# Altium footprint library PCB_THA.PcbLib: 22 footprints (part 2 of 2)
Each footprint in its own frame and in the unit in brackets; x right, y up, seen from the top. Pads: shape width x height; smd on the part's side, far side on the other; paste and mask are expansions set on the pad; w line width, h text height; cw(c..) or ccw(c..) is an arc to the next point about the centre after c.
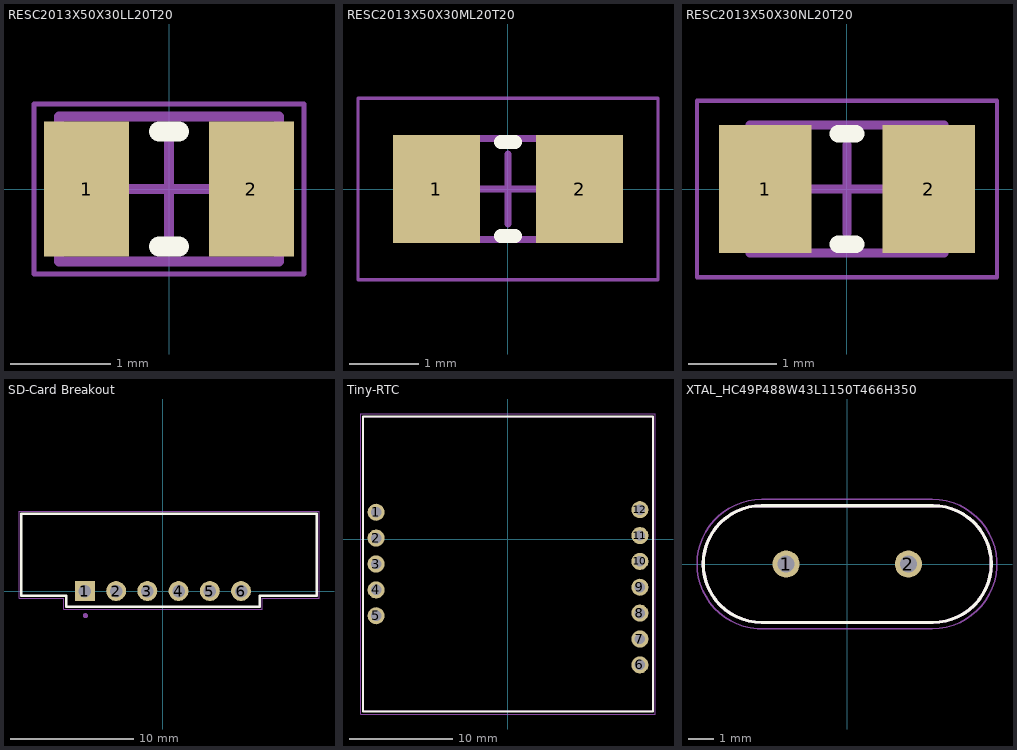
[diagram p1: the footprints below, top view; thin cyan lines are the x and y axes]

## RESC2013X50X30LL20T20 [mm] "Chip Resistor, 2-Leads, Body 2.00x1.25mm, IPC High Density"
height 0.5
pads (2):
  rect 0.85x1.35 smd: 1(-0.825,0) 2(0.825,0)
Top Overlay:
  lines w0.2: -0.1,-0.575 0.1,-0.575 ; -0.1,0.575 0.1,0.575
Top Designator:
  text ".Designator" at 7.618,-0.508 h1.52
Top 3D Body:
  lines w0.1: -1.1,-0.725 -1.1,0.725 1.1,0.725 1.1,-0.725 -1.1,-0.725
Top Courtyard:
  lines w0.05: -1.35,-0.85 -1.35,0.85 1.35,0.85 1.35,-0.85 -1.35,-0.85
  lines w0.1: -0.5,0 0.5,0 ; 0,-0.5 0,0.5
3D body: height 0.5, standoff 0, extent -0.8,-0.725 0.8,0.725
3D body: height 0.5, standoff 0, extent -1.1,-0.725 -0.8,0.725
3D body: height 0.5, standoff 0, extent 0.8,-0.725 1.1,0.725

## RESC2013X50X30ML20T20 [mm] "Chip Resistor, 2-Leads, Body 2.00x1.25mm, IPC Low Density"
height 0.5
pads (2):
  rect 1.25x1.55 smd: 1(-1.025,0) 2(1.025,0)
Top Overlay:
  lines w0.2: -0.1,-0.675 0.1,-0.675 ; -0.1,0.675 0.1,0.675
Top Designator:
  text ".Designator" at 7.618,-0.508 h1.52
Top 3D Body:
  lines w0.1: -1.1,-0.725 1.1,-0.725 1.1,0.725 -1.1,0.725 -1.1,-0.725
Top Courtyard:
  lines w0.05: -2.15,-1.3 2.15,-1.3 2.15,1.3 -2.15,1.3 -2.15,-1.3
  lines w0.1: -0.5,0 0.5,0 ; 0,-0.5 0,0.5
3D body: height 0.5, standoff 0, extent 0.8,-0.725 1.1,0.725
3D body: height 0.5, standoff 0, extent -1.1,-0.725 -0.8,0.725
3D body: height 0.5, standoff 0, extent -0.8,-0.725 0.8,0.725

## RESC2013X50X30NL20T20 [mm] "Chip Resistor, 2-Leads, Body 2.00x1.25mm, IPC Medium Density"
height 0.5
pads (2):
  rect 1.05x1.45 smd: 1(-0.925,0) 2(0.925,0)
Top Overlay:
  lines w0.2: -0.1,-0.625 0.1,-0.625 ; -0.1,0.625 0.1,0.625
Top Designator:
  text ".Designator" at 7.618,-0.508 h1.52
Top 3D Body:
  lines w0.1: -1.1,-0.725 1.1,-0.725 1.1,0.725 -1.1,0.725 -1.1,-0.725
Top Courtyard:
  lines w0.05: -1.7,-1 1.7,-1 1.7,1 -1.7,1 -1.7,-1
  lines w0.1: -0.5,0 0.5,0 ; 0,-0.5 0,0.5
3D body: height 0.5, standoff 0, extent 0.8,-0.725 1.1,0.725
3D body: height 0.5, standoff 0, extent -1.1,-0.725 -0.8,0.725
3D body: height 0.5, standoff 0, extent -0.8,-0.725 0.8,0.725

## SD-Card Breakout [mm]
pads (6):
  rect 1.62x1.62 hole 1.02: 1(-6.35,0)
  round 1.62 hole 1.02: 2(-3.81,0) 3(-1.27,0) 4(1.27,0) 5(3.81,0) 6(6.35,0)
Top Overlay:
  lines w0.2: -11.51,-0.4 -7.87,-0.4 -7.87,-1.27 7.87,-1.27 7.87,-0.4 12.49,-0.4 12.49,6.3 -11.51,6.3 -11.51,-0.4
Top Designator:
  text ".Designator" at 8.108,1.655 h1.52
Top 3D Body:
  circle w0.2: c-6.31,-2 r0.1
  lines w0.1: -11.51,-0.4 -11.51,6.3 12.49,6.3 12.49,-0.4 7.87,-0.4 7.87,-1.27 -7.87,-1.27 -7.87,-0.4 -11.51,-0.4
Top Courtyard:
  lines w0.05: -11.71,-0.6 -8.07,-0.6 -8.07,-1.47 8.07,-1.47 8.07,-0.6 8.29,-0.6 12.69,-0.6 12.69,6.5 12.49,6.5 -11.51,6.5 -11.71,6.5 -11.71,-0.6
3D body "PinSocket_1x06_P2.54mm_Vertical.step": height 7, standoff -3.1, extent -7.62,-1.27 7.62,1.27
3D body "MicroSD Reader.stp": height 51.9, standoff 5, extent -11.51,-0.4 12.49,6.3

## Tiny-RTC [mm]
pads (12):
  round 1.65 hole 1: 1(-12.75,2.63) 2(-12.75,0.13) 3(-12.75,-2.37) 4(-12.75,-4.87) 5(-12.75,-7.37) 6(12.75,-12.12) 7(12.75,-9.62) 8(12.75,-7.12) 9(12.75,-4.62) 10(12.75,-2.12) 11(12.75,0.38) 12(12.75,2.88)
Top Overlay:
  lines w0.2: -14,-16.62 14,-16.62 14,11.88 -14,11.88 -14,-16.62
Top Designator:
  text ".Designator" at 7.618,-2.878 h1.52
Top 3D Body:
  lines w0.15: -14,-16.62 -14,11.88 14,11.88 14,-16.62 -14,-16.62
Top Courtyard:
  lines w0.05: -14.25,-16.87 -14.25,12.13 14.25,12.13 14.25,-16.87 -14.25,-16.87
3D body "TinyRTC-DS1307.stp": height 12.76, standoff -8, extent -14,-16.62 14,11.88

## XTAL_HC49P488W43L1150T466H350 [mm]
pads (2):
  round 1.08 hole 0.68: 1(-2.44,0) 2(2.44,0)
Top Overlay:
  lines w0.127: -5.75,0 cw(c-3.42,0) -3.42,2.33 3.42,2.33 cw(c3.42,0) 5.75,0 cw(c3.42,0) 3.42,-2.33 -3.42,-2.33 cw(c-3.42,0) -5.75,0
Top Designator:
  text ".Designator" at 7.608,-0.509 h1.52
Top 3D Body:
  lines w0.127: -5.75,0 cw(c-3.42,0) -3.42,2.33 3.42,2.33 cw(c3.42,0) 5.75,0 cw(c3.42,0) 3.42,-2.33 -3.42,-2.33 cw(c-3.42,0) -5.75,0
Top Courtyard:
  lines w0.05: -6,-0.005 cw(c-3.415,-0.005) -3.415,2.58 ; -6,0.005 ccw(c-3.413,0.005) -3.322,-2.581 ; -3.41,2.58 3.4,2.58 cw(c3.4,0) 3.4,-2.58 -3.3,-2.58
3D body "step_temp.STEP": height 3.5, standoff -20.1, extent -5.75,-2.33 5.75,2.33